# Altium footprint library ICs And Semiconductors THD.PcbLib: 507 footprints (part 22 of 32)
Each footprint in its own frame and in the unit in brackets; x right, y up, seen from the top. Pads: shape width x height; smd on the part's side, far side on the other; paste and mask are expansions set on the pad; w line width, h text height; cw(c..) or ccw(c..) is an arc to the next point about the centre after c.
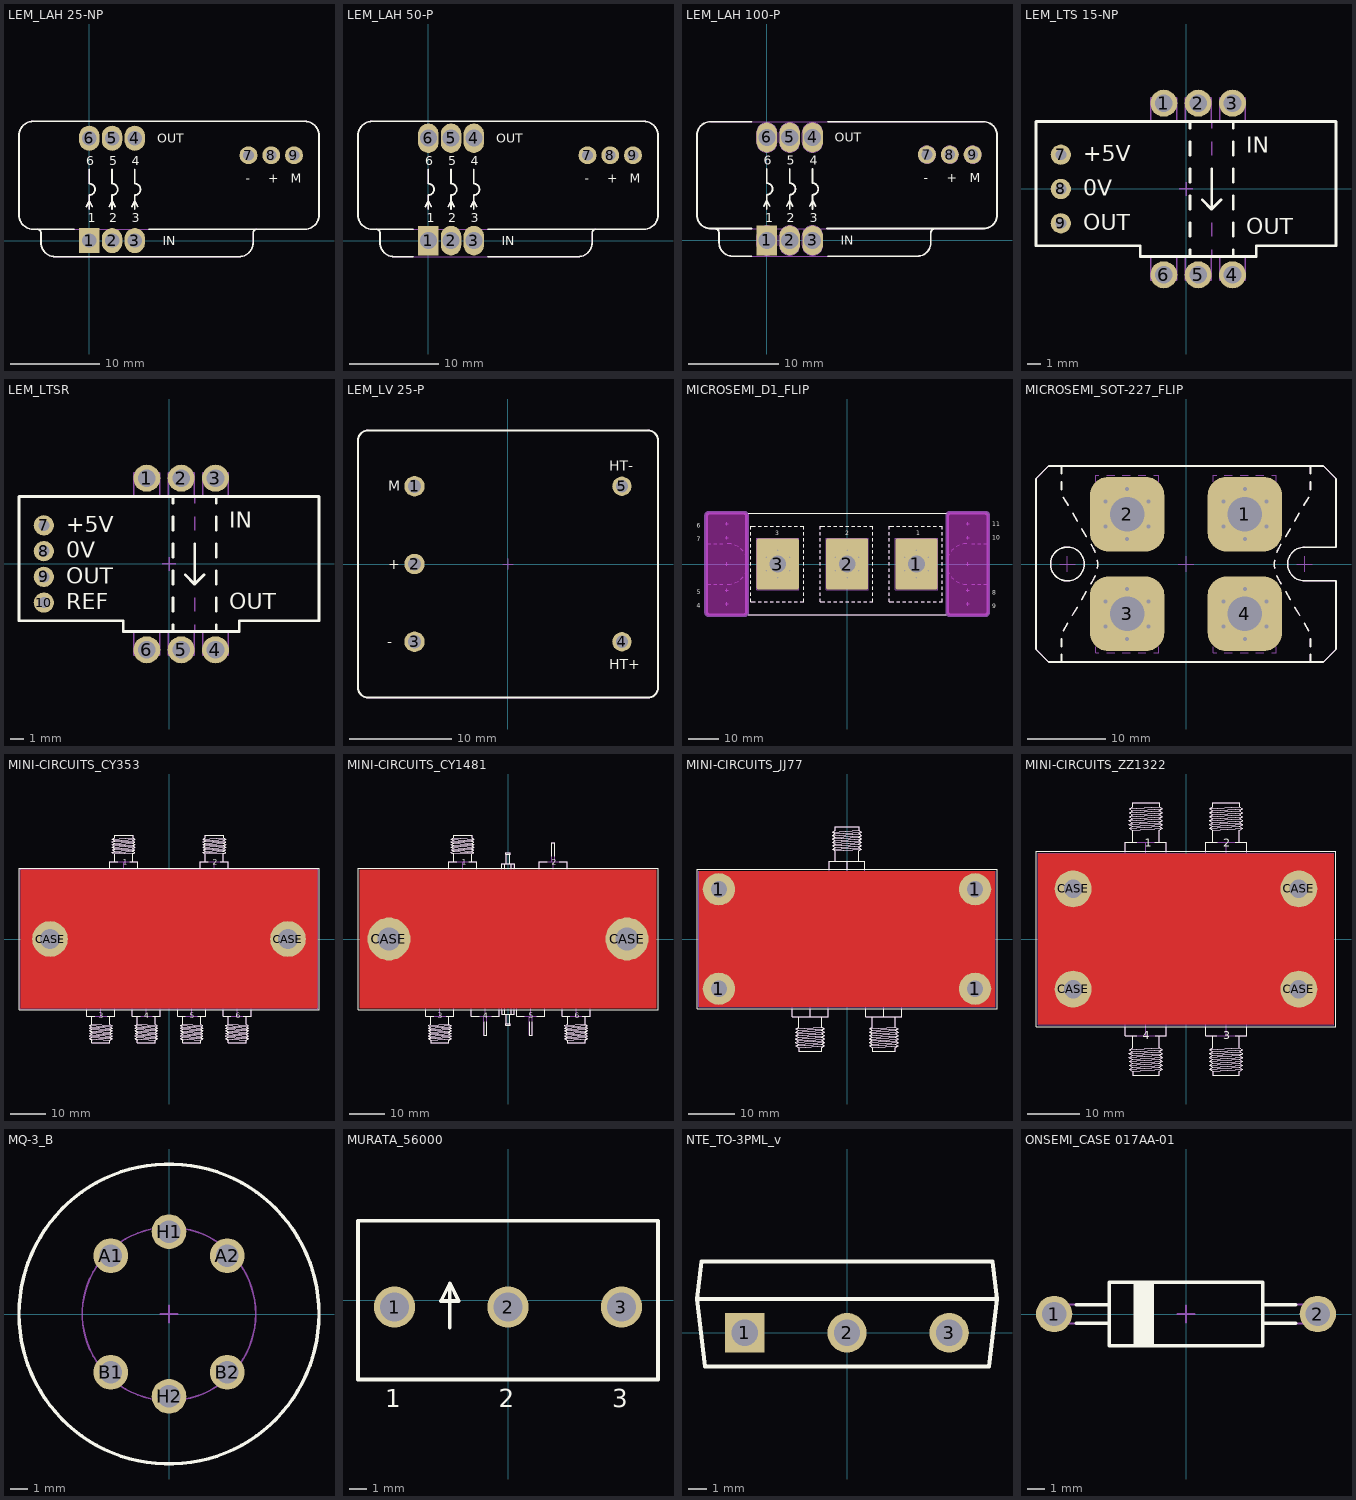
[diagram p21: the footprints below, top view; thin cyan lines are the x and y axes]

## LEM_LAH 25-NP [mm] "LEM Current Transducer, Body 33.5X15.13mm (max)"
height 21.2
pads (9):
  rect 2.28x2.8 hole 1.6: 1(0,0)
  oval 2.28x2.8 hole 1.6: 2(2.54,0) 3(5.08,0) 4(5.08,11.43) 5(2.54,11.43) 6(0,11.43)
  round 2 hole 1.2: 7(17.77,9.525) 8(20.31,9.525) 9(22.85,9.525)
Top Overlay:
  lines w0.2: -5.805,1.26 cw(c-5.805,0.86) -5.405,0.86 -5.405,-0.205 ccw(c-3.805,-0.205) -3.805,-1.805 16.695,-1.805 ccw(c16.695,-0.205) 18.295,-0.205 18.295,0.86 cw(c18.695,0.86) 18.695,1.26 ; -1.675,1.26 -6.255,1.26 cw(c-6.255,2.86) -7.855,2.86 -7.855,11.725 cw(c-6.255,11.725) -6.255,13.325 24.045,13.325 cw(c24.045,11.725) 25.645,11.725 25.645,2.86 cw(c24.045,2.86) 24.045,1.26 6.65,1.26 ; -0.318,3.81 0,4.445 0.318,3.81 ; 0,3.493 0,5.08 ccw(c0,5.715) 0,6.35 0,7.938 ; 2.222,3.81 2.54,4.445 2.857,3.81 ; 2.54,3.493 2.54,5.08 ccw(c2.54,5.715) 2.54,6.35 2.54,7.938 ; 4.763,3.81 5.08,4.445 5.398,3.81 ; 5.08,3.493 5.08,5.08 ccw(c5.08,5.715) 5.08,6.35 5.08,7.938
  text "IN" at 8.223,-0.5 h1.02
  text "OUT" at 7.557,10.93 h1.02
  text "3" at 4.747,2.04 h1.02
  text "4" at 4.747,8.39 h1.02
  text "2" at 2.207,2.04 h1.02
  text "5" at 2.207,8.39 h1.02
  text "1" at -0.167,2.04 h1.02
  text "6" at -0.333,8.39 h1.02
  text "+" at 19.987,6.485 h1.02
  text "-" at 17.447,6.485 h1.02
  text "M" at 22.517,6.485 h1.02
Mechanical 14:
  lines w0.1: -5.805,1.26 cw(c-5.805,0.86) -5.405,0.86 -5.405,-0.205 ccw(c-3.805,-0.205) -3.805,-1.805 16.695,-1.805 ccw(c16.695,-0.205) 18.295,-0.205 18.295,0.86 cw(c18.695,0.86) 18.695,1.26 ; -0.318,3.81 0,4.445 0.318,3.81 ; 0,3.493 0,5.08 ccw(c0,5.715) 0,6.35 0,7.938 ; 2.222,3.81 2.54,4.445 2.857,3.81 ; 2.54,3.493 2.54,5.08 ccw(c2.54,5.715) 2.54,6.35 2.54,7.938 ; 4.763,3.81 5.08,4.445 5.398,3.81 ; 5.08,3.493 5.08,5.08 ccw(c5.08,5.715) 5.08,6.35 5.08,7.938 ; -7.855,2.86 ccw(c-6.255,2.86) -6.255,1.26 24.045,1.26 ccw(c24.045,2.86) 25.645,2.86 25.645,11.725 ccw(c24.045,11.725) 24.045,13.325 -6.255,13.325 ccw(c-6.255,11.725) -7.855,11.725 -7.855,2.86
  text "IN" at 8.223,-0.5 h1.02
  text "OUT" at 7.557,10.93 h1.02
  text "3" at 4.747,2.04 h1.02
  text "4" at 4.747,8.39 h1.02
  text "2" at 2.207,2.04 h1.02
  text "5" at 2.207,8.39 h1.02
  text "1" at -0.167,2.04 h1.02
  text "6" at -0.333,8.39 h1.02
  text "+" at 19.987,6.485 h1.02
  text "-" at 17.447,6.485 h1.02
  text "M" at 22.517,6.485 h1.02
3D body "LEM_LAH 25-NP.stp": height 21, standoff -3.55, extent -7.755,-1.705 25.545,13.225

## LEM_LAH 50-P [mm] "LEM Current Transducer, Body 33.5X15.13mm (max)"
height 21.2
pads (9):
  rect 2.28x3.3 hole 1.9: 1(0,0)
  oval 2.28x3.3 hole 1.9: 2(2.54,0) 3(5.08,0) 4(5.08,11.43) 5(2.54,11.43) 6(0,11.43)
  round 2 hole 1.2: 7(17.77,9.525) 8(20.31,9.525) 9(22.85,9.525)
Top Overlay:
  lines w0.2: -5.805,1.26 cw(c-5.805,0.86) -5.405,0.86 -5.405,-0.205 ccw(c-3.805,-0.205) -3.805,-1.805 -1.675,-1.805 ; -1.675,1.26 -6.255,1.26 cw(c-6.255,2.86) -7.855,2.86 -7.855,11.725 cw(c-6.255,11.725) -6.255,13.325 24.045,13.325 cw(c24.045,11.725) 25.645,11.725 25.645,2.86 cw(c24.045,2.86) 24.045,1.26 6.65,1.26 ; -0.318,3.81 0,4.445 0.318,3.81 ; 0,3.493 0,5.08 ccw(c0,5.715) 0,6.35 0,7.938 ; 2.222,3.81 2.54,4.445 2.857,3.81 ; 2.54,3.493 2.54,5.08 ccw(c2.54,5.715) 2.54,6.35 2.54,7.938 ; 4.763,3.81 5.08,4.445 5.398,3.81 ; 5.08,3.493 5.08,5.08 ccw(c5.08,5.715) 5.08,6.35 5.08,7.938 ; 6.65,-1.805 16.695,-1.805 ccw(c16.695,-0.205) 18.295,-0.205 18.295,0.86 cw(c18.695,0.86) 18.695,1.26
  text "IN" at 8.223,-0.5 h1.02
  text "OUT" at 7.557,10.93 h1.02
  text "3" at 4.747,2.04 h1.02
  text "4" at 4.747,8.39 h1.02
  text "2" at 2.207,2.04 h1.02
  text "5" at 2.207,8.39 h1.02
  text "1" at -0.167,2.04 h1.02
  text "6" at -0.333,8.39 h1.02
  text "+" at 19.987,6.485 h1.02
  text "-" at 17.447,6.485 h1.02
  text "M" at 22.517,6.485 h1.02
Mechanical 14:
  lines w0.1: -5.805,1.26 cw(c-5.805,0.86) -5.405,0.86 -5.405,-0.205 ccw(c-3.805,-0.205) -3.805,-1.805 16.695,-1.805 ccw(c16.695,-0.205) 18.295,-0.205 18.295,0.86 cw(c18.695,0.86) 18.695,1.26 ; -0.318,3.81 0,4.445 0.318,3.81 ; 0,3.493 0,5.08 ccw(c0,5.715) 0,6.35 0,7.938 ; 2.222,3.81 2.54,4.445 2.857,3.81 ; 2.54,3.493 2.54,5.08 ccw(c2.54,5.715) 2.54,6.35 2.54,7.938 ; 4.763,3.81 5.08,4.445 5.398,3.81 ; 5.08,3.493 5.08,5.08 ccw(c5.08,5.715) 5.08,6.35 5.08,7.938 ; -7.855,2.86 ccw(c-6.255,2.86) -6.255,1.26 24.045,1.26 ccw(c24.045,2.86) 25.645,2.86 25.645,11.725 ccw(c24.045,11.725) 24.045,13.325 -6.255,13.325 ccw(c-6.255,11.725) -7.855,11.725 -7.855,2.86
  text "IN" at 8.223,-0.5 h1.02
  text "OUT" at 7.557,10.93 h1.02
  text "3" at 4.747,2.04 h1.02
  text "4" at 4.747,8.39 h1.02
  text "2" at 2.207,2.04 h1.02
  text "5" at 2.207,8.39 h1.02
  text "1" at -0.167,2.04 h1.02
  text "6" at -0.333,8.39 h1.02
  text "+" at 19.987,6.485 h1.02
  text "-" at 17.447,6.485 h1.02
  text "M" at 22.517,6.485 h1.02
3D body "LEM_LAH 50-P.stp": height 21, standoff -3.55, extent -7.755,-1.705 25.545,13.225

## LEM_LAH 100-P [mm] "LEM Current Transducer, Body 33.4 x 15.13mm (max)"
height 21.35
pads (9):
  rect 2.28x3.3 hole 1.9: 1(0,0)
  oval 2.28x3.3 hole 1.9: 2(2.54,0) 3(5.08,0) 4(5.08,11.43) 5(2.54,11.43) 6(0,11.43)
  round 2 hole 1.2: 7(17.77,9.525) 8(20.31,9.525) 9(22.85,9.525)
Top Overlay:
  lines w0.2: -1.675,-1.75 -3.174,-1.75 -3.8,-1.75 cw(c-3.8,-0.25) -5.3,-0.25 -5.3,0.815 ccw(c-5.8,0.815) -5.8,1.315 ; -1.675,1.315 -5.8,1.315 ; -1.675,13.18 -6.25,13.18 ccw(c-6.25,11.68) -7.75,11.68 -7.75,2.815 ccw(c-6.25,2.815) -6.25,1.315 -5.8,1.315 ; -0.318,3.81 0,4.445 0.318,3.81 ; 0,3.493 0,5.08 ccw(c0,5.715) 0,6.35 0,7.938 ; 2.222,3.81 2.54,4.445 2.857,3.81 ; 2.54,3.493 2.54,5.08 ccw(c2.54,5.715) 2.54,6.35 2.54,7.938 ; 4.763,3.81 5.08,4.445 5.398,3.81 ; 5.08,3.493 5.08,5.08 ccw(c5.08,5.715) 5.08,6.35 5.08,7.938 ; 6.65,1.315 18.7,1.315 ; 6.755,-1.75 16.7,-1.75 ccw(c16.7,-0.25) 18.2,-0.25 18.2,0.815 cw(c18.7,0.815) 18.7,1.315 ; 6.755,13.18 24.05,13.18 cw(c24.05,11.68) 25.55,11.68 25.55,2.815 cw(c24.05,2.815) 24.05,1.315 18.7,1.315
  text "IN" at 8.223,-0.5 h1.02
  text "OUT" at 7.557,10.93 h1.02
  text "3" at 4.747,2.04 h1.02
  text "4" at 4.747,8.39 h1.02
  text "2" at 2.207,2.04 h1.02
  text "5" at 2.207,8.39 h1.02
  text "1" at -0.167,2.04 h1.02
  text "6" at -0.333,8.39 h1.02
  text "+" at 19.987,6.485 h1.02
  text "-" at 17.447,6.485 h1.02
  text "M" at 22.517,6.485 h1.02
Notvisible:
  circle w0.1: c0,0 r0.95
  circle w0.1: c2.54,0 r0.95
  circle w0.1: c5.08,0 r0.95
  circle w0.1: c0,11.43 r0.95
  circle w0.1: c2.54,11.43 r0.95
  circle w0.1: c5.08,11.43 r0.95
  circle w0.1: c17.78,9.525 r0.6
  circle w0.1: c17.78,9.525 r0.95
  circle w0.1: c20.32,9.525 r0.6
  circle w0.1: c20.32,9.525 r0.95
  circle w0.1: c22.86,9.525 r0.6
  circle w0.1: c22.86,9.525 r0.95
  lines w0.1: -0.5,0 0,0 ; -0.5,11.43 0,11.43 ; 0,-0.5 0,0 ; 0,0.5 0,0 ; 0,10.93 0,11.43 ; 0,11.93 0,11.43 ; 0.5,0 0,0 ; 0.5,11.43 0,11.43 ; 2.04,0 2.54,0 ; 2.04,11.43 2.54,11.43 ; 2.54,-0.5 2.54,0 ; 2.54,0.5 2.54,0 ; 2.54,10.93 2.54,11.43 ; 2.54,11.93 2.54,11.43 ; 3.04,0 2.54,0 ; 3.04,11.43 2.54,11.43 ; 4.58,0 5.08,0 ; 4.58,11.43 5.08,11.43 ; 5.08,-0.5 5.08,0 ; 5.08,0.5 5.08,0 ; 5.08,10.93 5.08,11.43 ; 5.08,11.93 5.08,11.43 ; 5.58,0 5.08,0 ; 5.58,11.43 5.08,11.43 ; 17.28,9.525 17.78,9.525 ; 17.78,9.025 17.78,9.525 ; 17.78,10.025 17.78,9.525 ; 18.28,9.525 17.78,9.525 ; 19.82,9.525 20.32,9.525 ; 20.32,9.025 20.32,9.525 ; 20.32,10.025 20.32,9.525 ; 20.82,9.525 20.32,9.525 ; 22.36,9.525 22.86,9.525 ; 22.86,9.025 22.86,9.525 ; 22.86,10.025 22.86,9.525 ; 23.36,9.525 22.86,9.525 ; -1.14,-0.51 ccw(c0,-0.51) 1.14,-0.51 1.14,0.51 ccw(c0,0.51) -1.14,0.51 -1.14,-0.51 ; -1.14,10.92 ccw(c0,10.92) 1.14,10.92 1.14,11.94 ccw(c0,11.94) -1.14,11.94 -1.14,10.92 ; 1.4,-0.51 ccw(c2.54,-0.51) 3.68,-0.51 3.68,0.51 ccw(c2.54,0.51) 1.4,0.51 1.4,-0.51 ; 1.4,10.92 ccw(c2.54,10.92) 3.68,10.92 3.68,11.94 ccw(c2.54,11.94) 1.4,11.94 1.4,10.92 ; 3.94,-0.51 ccw(c5.08,-0.51) 6.22,-0.51 6.22,0.51 ccw(c5.08,0.51) 3.94,0.51 3.94,-0.51 ; 3.94,10.92 ccw(c5.08,10.92) 6.22,10.92 6.22,11.94 ccw(c5.08,11.94) 3.94,11.94 3.94,10.92
Mechanical 14:
  lines w0.1: -0.318,3.81 0,4.445 0.318,3.81 ; 0,3.493 0,5.08 ccw(c0,5.715) 0,6.35 0,7.938 ; 2.222,3.81 2.54,4.445 2.857,3.81 ; 2.54,3.493 2.54,5.08 ccw(c2.54,5.715) 2.54,6.35 2.54,7.938 ; 4.763,3.81 5.08,4.445 5.398,3.81 ; 5.08,3.493 5.08,5.08 ccw(c5.08,5.715) 5.08,6.35 5.08,7.938 ; -5.8,1.315 cw(c-5.8,0.815) -5.3,0.815 -5.3,-0.25 ccw(c-3.8,-0.25) -3.8,-1.75 -3.35,-1.75 -3.174,-1.759 14.05,-1.75 14.226,-1.759 16.074,-1.759 16.25,-1.75 16.7,-1.75 ccw(c16.7,-0.25) 18.2,-0.25 18.2,0.815 cw(c18.7,0.815) 18.7,1.315 ; -5.8,1.315 18.7,1.315 ; -5.8,1.315 -6.25,1.315 cw(c-6.25,2.815) -7.75,2.815 -7.75,11.68 cw(c-6.25,11.68) -6.25,13.18 24.05,13.18 cw(c24.05,11.68) 25.55,11.68 25.55,2.815 cw(c24.05,2.815) 24.05,1.315 18.7,1.315
  text "IN" at 8.223,-0.5 h1.02
  text "OUT" at 7.557,10.93 h1.02
  text "3" at 4.747,2.04 h1.02
  text "4" at 4.747,8.39 h1.02
  text "2" at 2.207,2.04 h1.02
  text "5" at 2.207,8.39 h1.02
  text "1" at -0.167,2.04 h1.02
  text "6" at -0.333,8.39 h1.02
  text "+" at 19.987,6.485 h1.02
  text "-" at 17.447,6.485 h1.02
  text "M" at 22.517,6.485 h1.02
3D body "LEM_LAH 100-P.stp": height 21, standoff -3.5, extent -7.755,-1.705 25.545,13.225

## LEM_LTS 15-NP [mm] "LEM Current Transducer, Body 22.2x10x24mm"
height 24.2
pads (9):
  round 2 hole 1.3: 1(-1.64,6.35) 2(0.9,6.35) 3(3.44,6.35) 4(3.44,-6.35) 5(0.9,-6.35) 6(-1.64,-6.35)
  round 1.5 hole 0.8: 7(-9.26,2.54) 8(-9.26,0) 9(-9.26,-2.54)
Top Overlay:
  lines w0.2: 0.3,-5 0.3,-4.5 ; 0.3,-3.5 0.3,-2.5 ; 0.3,-1.5 0.3,-0.5 ; 0.3,0.5 0.3,1.5 ; 0.3,2.5 0.3,3.5 ; 0.3,4.5 0.3,5 ; 1.193,-0.793 1.9,-1.5 ; 1.9,1.5 1.9,-1.5 ; 2.607,-0.793 1.9,-1.5 ; 3.5,-5 3.5,-4.5 ; 3.5,-3.5 3.5,-2.5 ; 3.5,-1.5 3.5,-0.5 ; 3.5,0.5 3.5,1.5 ; 3.5,2.5 3.5,3.5 ; 3.5,4.5 3.5,5 ; -11.1,-4.2 -11.1,5 11.1,5 11.1,-4.2 5.19,-4.2 5.19,-5 -3.39,-5 -3.39,-4.2 -11.1,-4.2
  text "OUT" at -7.62,-3.04 h1.2
  text "+5V" at -7.62,2.04 h1.2
  text "OUT" at 4.445,-3.358 h1.2
  text "IN" at 4.445,2.675 h1.2
  text "0V" at -7.62,-0.5 h1.2
Notvisible:
  lines w0.1: -9.76,-2.54 -9.26,-2.54 ; -9.76,0 -9.26,0 ; -9.76,2.54 -9.26,2.54 ; -9.26,-3.04 -9.26,-2.54 ; -9.26,-2.04 -9.26,-2.54 ; -9.26,-0.5 -9.26,0 ; -9.26,0.5 -9.26,0 ; -9.26,2.04 -9.26,2.54 ; -9.26,3.04 -9.26,2.54 ; -8.76,-2.54 -9.26,-2.54 ; -8.76,0 -9.26,0 ; -8.76,2.54 -9.26,2.54 ; -2.14,-6.35 -1.64,-6.35 ; -2.14,6.35 -1.64,6.35 ; -1.64,-6.85 -1.64,-6.35 ; -1.64,-5.85 -1.64,-6.35 ; -1.64,5.85 -1.64,6.35 ; -1.64,6.85 -1.64,6.35 ; -1.14,-6.35 -1.64,-6.35 ; -1.14,6.35 -1.64,6.35 ; -0.5,0 0,0 ; 0,-0.5 0,0 ; 0,0.5 0,0 ; 0.4,-6.35 0.9,-6.35 ; 0.4,6.35 0.9,6.35 ; 0.5,0 0,0 ; 0.9,-6.85 0.9,-6.35 ; 0.9,-5.85 0.9,-6.35 ; 0.9,5.85 0.9,6.35 ; 0.9,6.85 0.9,6.35 ; 1.4,-6.35 0.9,-6.35 ; 1.4,6.35 0.9,6.35 ; 1.9,-5 1.9,-4.5 ; 1.9,-3.5 1.9,-2.5 ; 1.9,-1.5 1.9,-0.5 ; 1.9,0.5 1.9,1.5 ; 1.9,2.5 1.9,3.5 ; 1.9,4.5 1.9,5 ; 2.94,-6.35 3.44,-6.35 ; 2.94,6.35 3.44,6.35 ; 3.44,-6.85 3.44,-6.35 ; 3.44,-5.85 3.44,-6.35 ; 3.44,5.85 3.44,6.35 ; 3.44,6.85 3.44,6.35 ; 3.94,-6.35 3.44,-6.35 ; 3.94,6.35 3.44,6.35
Mechanical 14:
  lines w0.1: -2.59,-5 -2.59,-6.75 -0.69,-6.75 -0.69,-5 ; -2.59,5 -2.59,6.75 -0.69,6.75 -0.69,5 ; -0.05,-5 -0.05,-6.75 1.85,-6.75 1.85,-5 ; -0.05,5 -0.05,6.75 1.85,6.75 1.85,5 ; 0.3,-5 0.3,-4.5 ; 0.3,-3.5 0.3,-2.5 ; 0.3,-1.5 0.3,-0.5 ; 0.3,0.5 0.3,1.5 ; 0.3,2.5 0.3,3.5 ; 0.3,4.5 0.3,5 ; 1.193,-0.793 1.9,-1.5 ; 1.9,1.5 1.9,-1.5 ; 2.49,-5 2.49,-6.75 4.39,-6.75 4.39,-5 ; 2.49,5 2.49,6.75 4.39,6.75 4.39,5 ; 2.607,-0.793 1.9,-1.5 ; 3.5,-5 3.5,-4.5 ; 3.5,-3.5 3.5,-2.5 ; 3.5,-1.5 3.5,-0.5 ; 3.5,0.5 3.5,1.5 ; 3.5,2.5 3.5,3.5 ; 3.5,4.5 3.5,5 ; -11.1,-4.2 -11.1,5 11.1,5 11.1,-4.2 5.19,-4.2 5.19,-5 -3.39,-5 -3.39,-4.2 -11.1,-4.2
  text "OUT" at -7.62,-3.04 h1.2
  text "+5V" at -7.62,2.04 h1.2
  text "OUT" at 4.445,-3.358 h1.2
  text "IN" at 4.445,2.675 h1.2
  text "0V" at -7.62,-0.5 h1.2
3D body "LEM_LTS 15-NP.stp": height 24.7, standoff -3.67, extent -11.1,-6.75 11.1,6.75

## LEM_LTSR [mm] "LEM Current Transducer, Body 22.2x10x24mm"
height 24.2
pads (10):
  round 2 hole 1.3: 1(-1.64,6.35) 2(0.9,6.35) 3(3.44,6.35) 4(3.44,-6.35) 5(0.9,-6.35) 6(-1.64,-6.35)
  round 1.5 hole 0.8: 7(-9.26,2.858) 8(-9.26,0.953) 9(-9.26,-0.953) 10(-9.26,-2.858)
Top Overlay:
  lines w0.2: 0.3,-5 0.3,-4.5 ; 0.3,-3.5 0.3,-2.5 ; 0.3,-1.5 0.3,-0.5 ; 0.3,0.5 0.3,1.5 ; 0.3,2.5 0.3,3.5 ; 0.3,4.5 0.3,5 ; 1.193,-0.793 1.9,-1.5 ; 1.9,1.5 1.9,-1.5 ; 2.607,-0.793 1.9,-1.5 ; 3.5,-5 3.5,-4.5 ; 3.5,-3.5 3.5,-2.5 ; 3.5,-1.5 3.5,-0.5 ; 3.5,0.5 3.5,1.5 ; 3.5,2.5 3.5,3.5 ; 3.5,4.5 3.5,5 ; -11.1,-4.2 -3.39,-4.2 -3.39,-5 5.19,-5 5.19,-4.2 11.1,-4.2 11.1,5 -11.1,5 -11.1,-4.2
  text "IN" at 4.445,2.675 h1.2
  text "OUT" at 4.445,-3.358 h1.2
  text "REF" at -7.62,-3.358 h1.2
  text "OUT" at -7.62,-1.453 h1.2
  text "0V" at -7.62,0.452 h1.2
  text "+5V" at -7.62,2.358 h1.2
Notvisible:
  lines w0.1: -9.76,-2.858 -9.26,-2.858 ; -9.76,-0.953 -9.26,-0.953 ; -9.76,0.953 -9.26,0.953 ; -9.76,2.858 -9.26,2.858 ; -9.26,-3.358 -9.26,-2.858 ; -9.26,-2.358 -9.26,-2.858 ; -9.26,-1.453 -9.26,-0.953 ; -9.26,-0.453 -9.26,-0.953 ; -9.26,0.453 -9.26,0.953 ; -9.26,1.453 -9.26,0.953 ; -9.26,2.358 -9.26,2.858 ; -9.26,3.358 -9.26,2.858 ; -8.76,-2.858 -9.26,-2.858 ; -8.76,-0.953 -9.26,-0.953 ; -8.76,0.953 -9.26,0.953 ; -8.76,2.858 -9.26,2.858 ; -2.14,-6.35 -1.64,-6.35 ; -2.14,6.35 -1.64,6.35 ; -1.64,-6.85 -1.64,-6.35 ; -1.64,-5.85 -1.64,-6.35 ; -1.64,5.85 -1.64,6.35 ; -1.64,6.85 -1.64,6.35 ; -1.14,-6.35 -1.64,-6.35 ; -1.14,6.35 -1.64,6.35 ; -0.5,0 0,0 ; 0,-0.5 0,0 ; 0,0.5 0,0 ; 0.4,-6.35 0.9,-6.35 ; 0.4,6.35 0.9,6.35 ; 0.5,0 0,0 ; 0.9,-6.85 0.9,-6.35 ; 0.9,-5.85 0.9,-6.35 ; 0.9,5.85 0.9,6.35 ; 0.9,6.85 0.9,6.35 ; 1.4,-6.35 0.9,-6.35 ; 1.4,6.35 0.9,6.35 ; 1.9,-5 1.9,-4.5 ; 1.9,-3.5 1.9,-2.5 ; 1.9,-1.5 1.9,-0.5 ; 1.9,0.5 1.9,1.5 ; 1.9,2.5 1.9,3.5 ; 1.9,4.5 1.9,5 ; 2.94,-6.35 3.44,-6.35 ; 2.94,6.35 3.44,6.35 ; 3.44,-6.85 3.44,-6.35 ; 3.44,-5.85 3.44,-6.35 ; 3.44,5.85 3.44,6.35 ; 3.44,6.85 3.44,6.35 ; 3.94,-6.35 3.44,-6.35 ; 3.94,6.35 3.44,6.35
Mechanical 14:
  lines w0.1: -2.59,-5 -2.59,-6.75 -0.69,-6.75 -0.69,-5 ; -2.59,5 -2.59,6.75 -0.69,6.75 -0.69,5 ; -0.05,-5 -0.05,-6.75 1.85,-6.75 1.85,-5 ; -0.05,5 -0.05,6.75 1.85,6.75 1.85,5 ; 0.3,-5 0.3,-4.5 ; 0.3,-3.5 0.3,-2.5 ; 0.3,-1.5 0.3,-0.5 ; 0.3,0.5 0.3,1.5 ; 0.3,2.5 0.3,3.5 ; 0.3,4.5 0.3,5 ; 1.193,-0.793 1.9,-1.5 ; 1.9,1.5 1.9,-1.5 ; 2.49,-5 2.49,-6.75 4.39,-6.75 4.39,-5 ; 2.49,5 2.49,6.75 4.39,6.75 4.39,5 ; 2.607,-0.793 1.9,-1.5 ; 3.5,-5 3.5,-4.5 ; 3.5,-3.5 3.5,-2.5 ; 3.5,-1.5 3.5,-0.5 ; 3.5,0.5 3.5,1.5 ; 3.5,2.5 3.5,3.5 ; 3.5,4.5 3.5,5 ; -11.1,-4.2 -3.39,-4.2 -3.39,-5 5.19,-5 5.19,-4.2 11.1,-4.2 11.1,5 -11.1,5 -11.1,-4.2
  text "IN" at 4.445,2.675 h1.2
  text "OUT" at 4.445,-3.358 h1.2
  text "REF" at -7.62,-3.358 h1.2
  text "OUT" at -7.62,-1.453 h1.2
  text "0V" at -7.62,0.452 h1.2
  text "+5V" at -7.62,2.358 h1.2
3D body "LEM_LTSR.stp": height 24.7, standoff -3.67, extent -11.1,-6.75 11.1,6.75

## LEM_LV 25-P [mm] "LEM Current Transducer, Body 29.2x26mm"
height 16.45
pads (5):
  round 2 hole 1.3: 1(-9.16,7.62) 2(-9.16,0) 3(-9.16,-7.62)
  round 1.9 hole 1.2: 4(11.16,-7.62) 5(11.16,7.62)
Top Overlay:
  lines w0.2: -14.7,-12.1 ccw(c-13.7,-12.1) -13.7,-13.1 13.7,-13.1 ccw(c13.7,-12.1) 14.7,-12.1 14.7,12.1 ccw(c13.7,12.1) 13.7,13.1 -13.7,13.1 ccw(c-13.7,12.1) -14.7,12.1 -14.7,-12.1
  text "+" at -11.725,-0.5 h1
  text "M" at -11.755,7.154 h1
  text "-" at -11.832,-8.086 h1
  text "HT-" at 9.909,9.131 h1
  text "HT+" at 9.915,-10.298 h1
Notvisible:
  lines w0.1: -9.66,-7.62 -9.16,-7.62 ; -9.66,0 -9.16,0 ; -9.66,7.62 -9.16,7.62 ; -9.16,-8.12 -9.16,-7.62 ; -9.16,-7.12 -9.16,-7.62 ; -9.16,-0.5 -9.16,0 ; -9.16,0.5 -9.16,0 ; -9.16,7.12 -9.16,7.62 ; -9.16,8.12 -9.16,7.62 ; -8.66,-7.62 -9.16,-7.62 ; -8.66,0 -9.16,0 ; -8.66,7.62 -9.16,7.62 ; -0.5,0 0,0 ; 0,-0.5 0,0 ; 0,0.5 0,0 ; 0.5,0 0,0 ; 10.66,-7.62 11.16,-7.62 ; 10.66,7.62 11.16,7.62 ; 11.16,-8.12 11.16,-7.62 ; 11.16,-7.12 11.16,-7.62 ; 11.16,7.12 11.16,7.62 ; 11.16,8.12 11.16,7.62 ; 11.66,-7.62 11.16,-7.62 ; 11.66,7.62 11.16,7.62
Mechanical 14:
  lines w0.1: -14.7,-12.1 ccw(c-13.7,-12.1) -13.7,-13.1 13.7,-13.1 ccw(c13.7,-12.1) 14.7,-12.1 14.7,12.1 ccw(c13.7,12.1) 13.7,13.1 -13.7,13.1 ccw(c-13.7,12.1) -14.7,12.1 -14.7,-12.1
  text "-" at -11.832,-8.086 h1
  text "M" at -11.755,7.154 h1
  text "+" at -11.725,-0.5 h1
  text "HT-" at 9.909,9.131 h1
  text "HT+" at 9.915,-10.298 h1
3D body "LEM_LV 25-P.stp": height 16.65, standoff -3.2, extent -14.7,-13.1 14.7,13.1

## MICROSEMI_D1_FLIP [mm] "MICROSEMI D1 Package Module, Body 94mm x 34mm, Screws on PCB Version"
height 31
pads (3):
  rrect10% 14x17 hole 5.5: 1(23,0) 2(0,0) 3(-23,0)
via 26.897,-2.25 diameter 1 hole 0.5
via 26.897,2.25 diameter 1 hole 0.5
via 19.103,-2.25 diameter 1 hole 0.5
via 23,4.5 diameter 1 hole 0.5
via 19.103,2.25 diameter 1 hole 0.5
via 23,-4.5 diameter 1 hole 0.5
via 0,-4.5 diameter 1 hole 0.5
via -3.897,2.25 diameter 1 hole 0.5
via 0,4.5 diameter 1 hole 0.5
via -3.897,-2.25 diameter 1 hole 0.5
via 3.897,2.25 diameter 1 hole 0.5
via 3.897,-2.25 diameter 1 hole 0.5
via -23,-4.5 diameter 1 hole 0.5
via -26.897,2.25 diameter 1 hole 0.5
via -23,4.5 diameter 1 hole 0.5
via -26.897,-2.25 diameter 1 hole 0.5
via -19.103,2.25 diameter 1 hole 0.5
via -19.103,-2.25 diameter 1 hole 0.5
Top Overlay:
  lines w0.2: -32.8,-16.906 32.8,-16.906 ; -32.8,16.894 32.8,16.894 ; -32,-11.494 -32,-12.506 -30.5,-12.506 ; -32,-10.494 -32,-9.494 ; -32,-8.494 -32,-7.494 ; -32,-6.494 -32,-5.494 ; -32,-4.494 -32,-3.494 ; -32,-2.494 -32,-1.494 ; -32,-0.494 -32,0.506 ; -32,1.506 -32,2.506 ; -32,3.506 -32,4.506 ; -32,5.506 -32,6.506 ; -32,7.506 -32,8.506 ; -32,9.506 -32,10.506 ; -32,11.506 -32,12.494 -30.5,12.494 ; -29.5,-12.506 -28.5,-12.506 ; -29.5,12.494 -28.5,12.494 ; -27.5,-12.506 -26.5,-12.506 ; -27.5,12.494 -26.5,12.494 ; -25.5,-12.506 -24.5,-12.506 ; -25.5,12.494 -24.5,12.494 ; -23.5,-12.506 -22.5,-12.506 ; -23.5,12.494 -22.5,12.494 ; -21.5,-12.506 -20.5,-12.506 ; -21.5,12.494 -20.5,12.494 ; -19.5,-12.506 -18.5,-12.506 ; -19.5,12.494 -18.5,12.494 ; -17.5,-12.506 -16.5,-12.506 ; -17.5,12.494 -16.5,12.494 ; -15.5,-12.506 -14.46,-12.506 -14.46,-11.494 ; -15.5,12.494 -14.46,12.494 -14.46,11.506 ; -14.46,-10.494 -14.46,-9.494 ; -14.46,-8.494 -14.46,-7.494 ; -14.46,-6.494 -14.46,-5.494 ; -14.46,-4.494 -14.46,-3.494 ; -14.46,-2.494 -14.46,-1.494 ; -14.46,-0.494 -14.46,0.506 ; -14.46,1.506 -14.46,2.506 ; -14.46,3.506 -14.46,4.506 ; -14.46,5.506 -14.46,6.506 ; -14.46,7.506 -14.46,8.506 ; -14.46,9.506 -14.46,10.506 ; -9,-11.494 -9,-12.506 -7.5,-12.506 ; -9,-10.494 -9,-9.494 ; -9,-8.494 -9,-7.494 ; -9,-6.494 -9,-5.494 ; -9,-4.494 -9,-3.494 ; -9,-2.494 -9,-1.494 ; -9,-0.494 -9,0.506 ; -9,1.506 -9,2.506 ; -9,3.506 -9,4.506 ; -9,5.506 -9,6.506 ; -9,7.506 -9,8.506 ; -9,9.506 -9,10.506 ; -9,11.506 -9,12.494 -7.5,12.494 ; -6.5,-12.506 -5.5,-12.506 ; -6.5,12.494 -5.5,12.494 ; -4.5,-12.506 -3.5,-12.506 ; -4.5,12.494 -3.5,12.494 ; -2.5,-12.506 -1.5,-12.506 ; -2.5,12.494 -1.5,12.494 ; -0.5,-12.506 0.5,-12.506 ; -0.5,12.494 0.5,12.494 ; 1.5,-12.506 2.5,-12.506 ; 1.5,12.494 2.5,12.494 ; 3.5,-12.506 4.5,-12.506 ; 3.5,12.494 4.5,12.494 ; 5.5,-12.506 6.5,-12.506 ; 5.5,12.494 6.5,12.494 ; 7.5,-12.506 8.54,-12.506 8.54,-11.494 ; 7.5,12.494 8.54,12.494 8.54,11.506 ; 8.54,-10.494 8.54,-9.494 ; 8.54,-8.494 8.54,-7.494 ; 8.54,-6.494 8.54,-5.494 ; 8.54,-4.494 8.54,-3.494 ; 8.54,-2.494 8.54,-1.494 ; 8.54,-0.494 8.54,0.506 ; 8.54,1.506 8.54,2.506 ; 8.54,3.506 8.54,4.506 ; 8.54,5.506 8.54,6.506 ; 8.54,7.506 8.54,8.506 ; 8.54,9.506 8.54,10.506 ; 14,-11.494 14,-12.506 15.5,-12.506 ; 14,-10.494 14,-9.494 ; 14,-8.494 14,-7.494 ; 14,-6.494 14,-5.494 ; 14,-4.494 14,-3.494 ; 14,-2.494 14,-1.494 ; 14,-0.494 14,0.506 ; 14,1.506 14,2.506 ; 14,3.506 14,4.506 ; 14,5.506 14,6.506 ; 14,7.506 14,8.506 ; 14,9.506 14,10.506 ; 14,11.506 14,12.494 15.5,12.494 ; 16.5,-12.506 17.5,-12.506 ; 16.5,12.494 17.5,12.494 ; 18.5,-12.506 19.5,-12.506 ; 18.5,12.494 19.5,12.494 ; 20.5,-12.506 21.5,-12.506 ; 20.5,12.494 21.5,12.494 ; 22.5,-12.506 23.5,-12.506 ; 22.5,12.494 23.5,12.494 ; 24.5,-12.506 25.5,-12.506 ; 24.5,12.494 25.5,12.494 ; 26.5,-12.506 27.5,-12.506 ; 26.5,12.494 27.5,12.494 ; 28.5,-12.506 29.5,-12.506 ; 28.5,12.494 29.5,12.494 ; 30.5,-12.506 31.54,-12.506 31.54,-11.494 ; 30.5,12.494 31.54,12.494 31.54,11.506 ; 31.54,-10.494 31.54,-9.494 ; 31.54,-8.494 31.54,-7.494 ; 31.54,-6.494 31.54,-5.494 ; 31.54,-4.494 31.54,-3.494 ; 31.54,-2.494 31.54,-1.494 ; 31.54,-0.494 31.54,0.506 ; 31.54,1.506 31.54,2.506 ; 31.54,3.506 31.54,4.506 ; 31.54,5.506 31.54,6.506 ; 31.54,7.506 31.54,8.506 ; 31.54,9.506 31.54,10.506